# Altium footprint library MEBot.PcbLib: 161 footprints (part 8 of 11)
Each footprint in its own frame and in the unit in brackets; x right, y up, seen from the top. Pads: shape width x height; smd on the part's side, far side on the other; paste and mask are expansions set on the pad; w line width, h text height; cw(c..) or ccw(c..) is an arc to the next point about the centre after c.
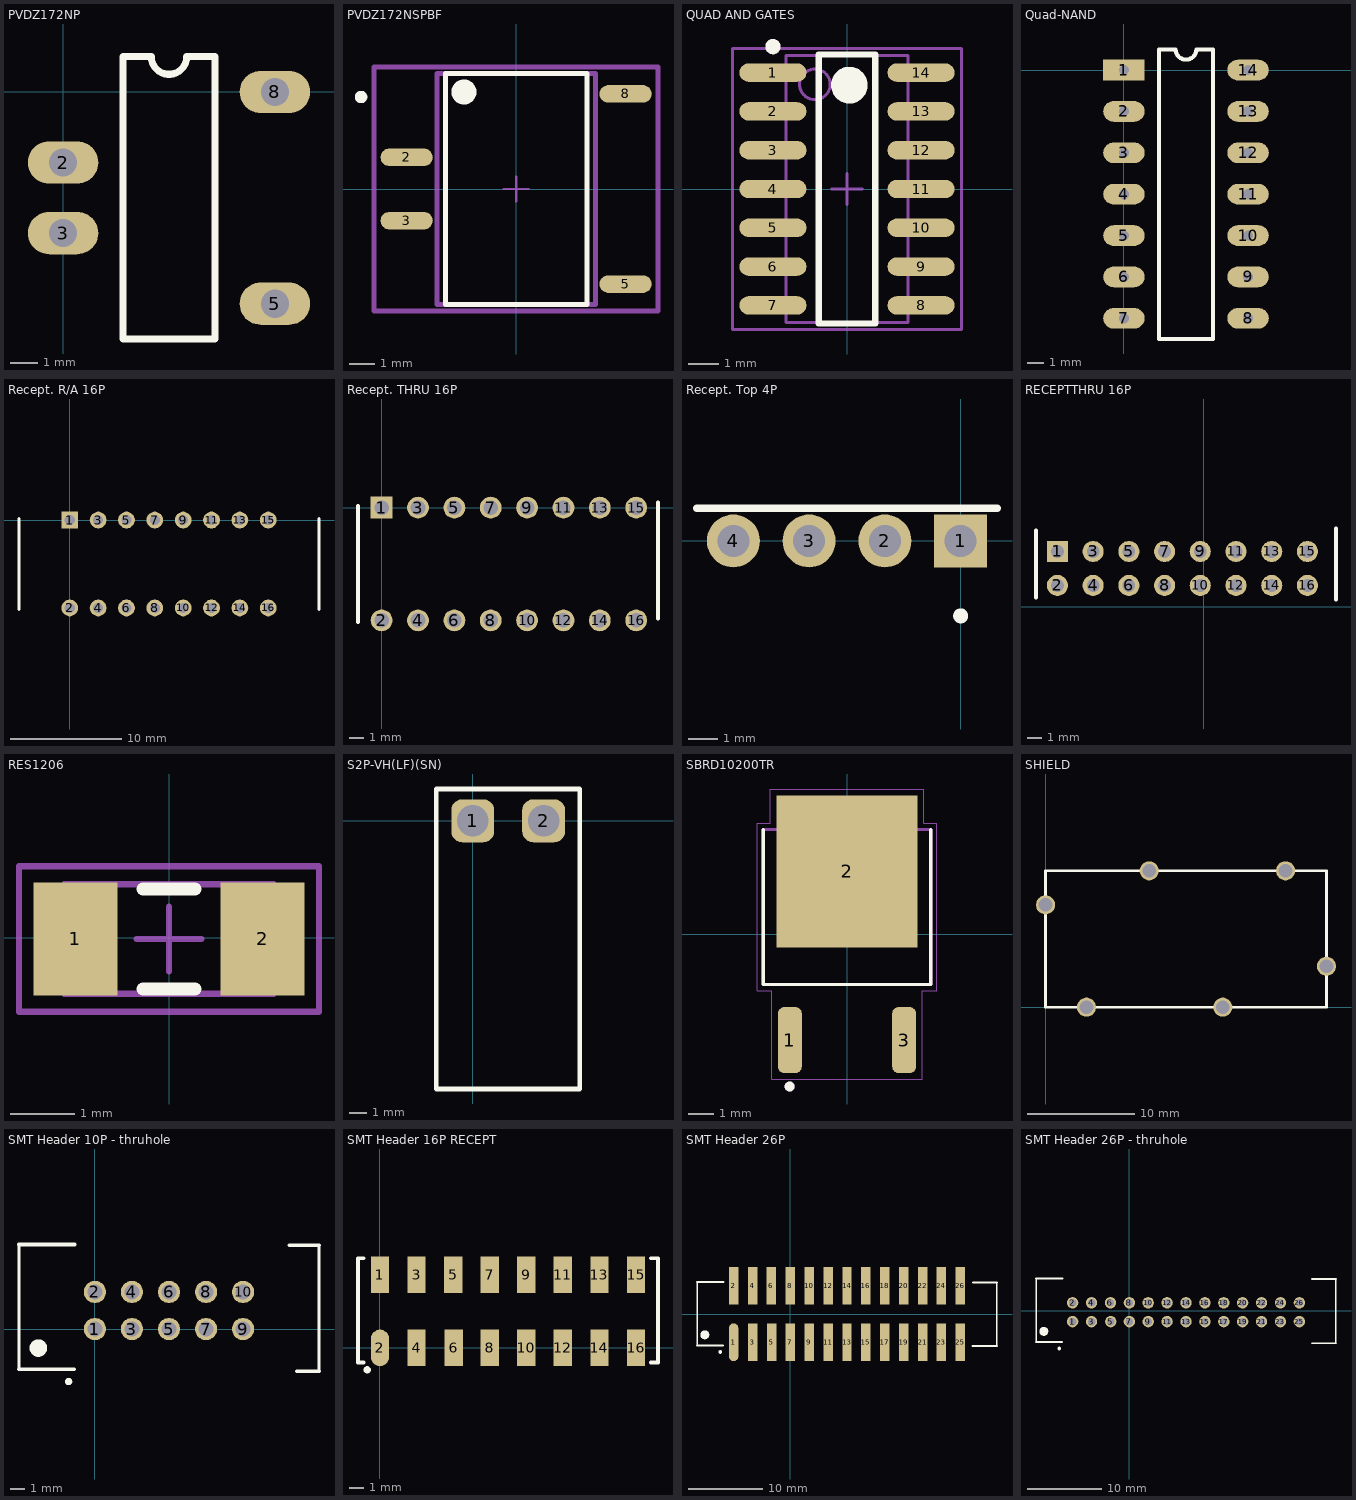
[diagram p7: the footprints below, top view; thin cyan lines are the x and y axes]

## PVDZ172NP [mil]
pads (4):
  oval 100x60 hole 40: 2(0,-100) 3(0,-200) 5(300,-300) 8(300,0)
Top Overlay:
  lines w10: 85,-350 85,50 125,50 ccw(c150,50) 175,50 215,50 215,-350 85,-350

## PVDZ172NSPBF [mil] "PVDZ Photovoltaic 1.5 A 60 V 0.25 Ohm SPST (1 Form A) Solid State Relay -MDIP-8"
pads (4):
  rrect100% 82.46x27.57 smd paste+0 mask+0: 2(-172.65,50) 3(-172.65,-50) 5(172.65,-150) 8(172.65,150)
Top Overlay:
  circle w19.68: c-82.2,152.95 r9.84
  circle w9.84: c-244.39,145.08 r4.92
  lines w7.87: -111.73,-182.48 111.73,-182.48 111.73,182.48 -111.73,182.48 -111.73,-182.48
Top 3D Body:
  lines w7.87: -125,-182.48 125,-182.48 125,182.48 -125,182.48 -125,-182.48
Top Courtyard:
  lines w7.87: -223.72,-192.32 223.72,-192.32 223.72,192.32 -223.72,192.32 -223.72,-192.32
Top Assembly:
  lines w7.87: -223.72,-192.32 223.72,-192.32 223.72,192.32 -223.72,192.32 -223.72,-192.32
  text ".Designator" at 0,7.38 h39.37
Board:
  lines w3.94: -19.68,0 19.68,0 ; 0,-19.68 0,19.68
3D body "Relay_Infineon_PVDZ172NSPBF_eec.STEP": height 10, standoff 0, extent -223.72,-192.32 223.72,192.32

## QUAD AND GATES [mm] "SOIC, 14-Leads, Body 8.8x4.0mm (max), Pitch 1.27mm, IPC Medium Density"
height 1.75
pads (14):
  oval 2.2x0.6 smd: 1(-2.425,3.81) 2(-2.425,2.54) 3(-2.425,1.27) 4(-2.425,0) 5(-2.425,-1.27) 6(-2.425,-2.54) 7(-2.425,-3.81) 8(2.425,-3.81) 9(2.425,-2.54) 10(2.425,-1.27) 11(2.425,0) 12(2.425,1.27) 13(2.425,2.54) 14(2.425,3.81)
Top Overlay:
  circle w0.25: c-2.425,4.66 r0.125
  circle w0.6: c0.075,3.4 r0.3
  lines w0.2: -0.925,-4.4 -0.925,4.4 0.925,4.4 0.925,-4.4 -0.925,-4.4
Mechanical 13:
  circle w0.1: c-1.05,3.425 r0.5
  lines w0.1: -2,-4.375 -2,4.375 2,4.375 2,-4.375 -2,-4.375
Mechanical 15:
  lines w0.1: -0.5,0 0.5,0 ; 0,-0.5 0,0.5 ; -3.75,-4.6 -3.75,4.6 3.75,4.6 3.75,-4.6 -3.75,-4.6
3D body: height 1.75, standoff 0.25, extent -2,-4.375 2,4.375

## Quad-NAND [mil]
pads (14):
  rect 100x50 hole 25: 1(0,0)
  oval 100x50 hole 25: 2(0,-100) 3(0,-200) 4(0,-300) 5(0,-400) 6(0,-500) 7(0,-600) 8(300,-600) 9(300,-500) 10(300,-400) 11(300,-300) 12(300,-200) 13(300,-100) 14(300,0)
Top Overlay:
  lines w10: 85,-650 215,-650 215,50 175,50 cw(c150,50) 125,50 85,50 85,-650

## Recept. R/A 16P [mm] "Tyco P/N 5-532956-8"
height 6.05
pads (16):
  rect 1.5x1.5 hole 0.9: 1(0,0)
  round 1.5 hole 0.9: 2(0,-7.874) 3(2.54,0) 4(2.54,-7.874) 5(5.08,0) 6(5.08,-7.874) 7(7.62,0) 8(7.62,-7.874) 9(10.16,0) 10(10.16,-7.874) 11(12.7,0) 12(12.7,-7.874) 13(15.24,0) 14(15.24,-7.874) 15(17.78,0) 16(17.78,-7.874)
Top Overlay:
  lines w0.254: -4.547,-8.001 -4.547,0.127 ; 22.327,-8.001 22.327,0.127
3D body "c-5-532956-2-af1-3d.stp": height 6.02, standoff -2.94, extent -4.537,-7.928 22.337,0.2

## Recept. THRU 16P [mil] "Tyco P/N 5-532956-8"
height 238.19
pads (16):
  rect 60x60 hole 40: 1(0,0)
  round 60 hole 40: 2(0,-310) 3(100,0) 4(100,-310) 5(200,0) 6(200,-310) 7(300,0) 8(300,-310) 9(400,0) 10(400,-310) 11(500,0) 12(500,-310) 13(600,0) 14(600,-310) 15(700,0) 16(700,-310)
Top Overlay:
  lines w10: -65,-315 -65,5 ; 760,-305 760,15
3D body "71991308lf.stp": height 290, standoff -99.76, extent -50,-303.94 746.85,3.94

## Recept. Top 4P [mil] "4 pin Molex Receptacle - 22-02-2045"
height 310
pads (4):
  rect 70x70 hole 42: 1(0,0)
  round 70 hole 42: 2(-100,0) 3(-200,0) 4(-300,0)
Top Overlay:
  circle w9.84: c0,-99 r4.92
  lines w10: -348,43 48,43
3D body "022182041.stp": height 310, standoff -132, extent -348,-145 48,160

## RECEPTTHRU 16P [mm]
pads (16):
  rect 1.5x1.5 hole 0.9: 1(-10.414,3.937)
  round 1.5 hole 0.9: 2(-10.414,1.524) 3(-7.874,3.937) 4(-7.874,1.524) 5(-5.334,3.937) 6(-5.334,1.524) 7(-2.794,3.937) 8(-2.794,1.524) 9(-0.254,3.937) 10(-0.254,1.524) 11(2.286,3.937) 12(2.286,1.524) 13(4.826,3.937) 14(4.826,1.524) 15(7.366,3.937) 16(7.366,1.524)
Top Overlay:
  lines w0.254: -11.938,0.635 -11.938,5.461 ; 9.398,0.508 9.398,5.588
3D body "recept16pthru.stp": height 8.89, standoff -2.71, extent -11.684,0.254 8.636,5.314

## RES1206 [mm] "Chip Resistor, 2-Leads, Body 3.1x1.6mm, IPC Medium Density"
height 0.65
pads (2):
  rect 1.3x1.75 smd: 1(-1.457,-0.019) 2(1.443,-0.019)
Top Overlay:
  lines w0.2: -0.407,-0.794 0.393,-0.794 ; -0.407,0.756 0.393,0.756
Mechanical 13:
  lines w0.1: -1.632,-0.869 -1.632,0.831 1.618,0.831 1.618,-0.869 -1.632,-0.869
Mechanical 15:
  lines w0.1: -0.507,-0.019 0.493,-0.019 ; -0.007,-0.519 -0.007,0.481 ; -2.332,-1.144 -2.332,1.106 2.318,1.106 2.318,-1.144 -2.332,-1.144
3D body: height 0.65, standoff 0, extent -1.632,-0.869 1.618,0.831

## S2P-VH(LF)(SN) [mm] "CONN HEADER R/A 2POS 3.96MM"
pads (2):
  rrect50% 2.4x2.4 hole 1.75: 1(0,0) 2(3.962,0)
Top Overlay:
  lines w0.254: -2.032,-14.986 -2.032,1.778 5.969,1.778 5.969,-14.986 -2.032,-14.986
3D body "User Library-B2PS-VH.STEP": height 8.57, standoff -3.83, extent -2.025,-14.835 5.835,0.635

## SBRD10200TR [mm] "DIODE SCHOTTKY 200V 10A DPAK"
pads (3):
  rrect50% 0.95x2.64 smd: 1(-2.286,-4.24) 3(2.286,-4.24)
  rect 5.63x6.09 smd paste-4: 2(0,2.51)
Top Overlay:
  circle w0.2: c-2.3,-6.1 r0.1
  lines w0.127: -3.35,4.185 -3.35,-2.015 3.35,-2.015 3.35,4.185
Bottom Overlay:
  lines w0.127: 3.35,-2.015 3.35,4.185
Top Paste:
  region: 0.655,1.78 -0.655,1.78 -0.655,3.24 0.655,3.24
  region: 0.655,3.81 -0.655,3.81 -0.655,5.27 0.655,5.27
  region: 0.655,-0.25 -0.655,-0.25 -0.655,1.21 0.655,1.21
  region: -1.225,3.81 -2.535,3.81 -2.535,5.27 -1.225,5.27
  region: -1.225,1.78 -2.535,1.78 -2.535,3.24 -1.225,3.24
  region: -1.225,-0.25 -2.535,-0.25 -2.535,1.21 -1.225,1.21
  region: 2.535,-0.25 1.225,-0.25 1.225,1.21 2.535,1.21
  region: 2.535,3.81 1.225,3.81 1.225,5.27 2.535,5.27
  region: 2.535,1.78 1.225,1.78 1.225,3.24 2.535,3.24
Mechanical 13:
  circle w0.2: c-2.3,-6.1 r0.1
  lines w0.127: -3.35,-2.015 3.35,-2.015 3.35,4.185 -3.35,4.185 -3.35,-2.015
Mechanical 15:
  lines w0.05: -3.6,-2.27 -3.6,4.44 -3.065,4.44 -3.065,5.81 3.065,5.81 3.065,4.44 3.6,4.44 3.6,-2.27 3.02,-2.27 3.02,-5.81 -3.02,-5.81 -3.02,-2.27 -3.6,-2.27

## SHIELD [mil] "RF SHIELD 0.5\" X 1\" THROUGH HOLE"
height 5118.11
pads (6):
  round 70 hole 50: ""(0,375) ""(150,0) ""(380,500) ""(650,0) ""(880,500) ""(1030,150)
Top Overlay:
  lines w10: 0,0 1030,0 1030,500 0,500 0,0

## SMT Header 10P - thruhole [mil] "Box Header, SMT 10 Leads; Row Spacing 6.86 mm; Pitch 2.54 mm"
height 393.7
pads (10):
  round 60 hole 40: 1(0,0) 2(0,100) 3(100,0) 4(100,100) 5(200,0) 6(200,100) 7(300,0) 8(300,100) 9(400,0) 10(400,100)
Top Overlay:
  circle w23.62: c-152.76,-51.38 r11.81
  circle w9.84: c-71.06,-141.93 r4.92
  lines w7.87: -205,-108.46 -205,227.95 ; 605,-114.37 605,226.44
  lines w10: -205,-108.46 -56.3,-108.46 ; -205,227.95 -54.53,227.95 ; 525,226.44 605,226.44 ; 545,-114.37 605,-114.37
3D body "10PTHRU HEADER.stp": height 370, standoff -132, extent -189,-111.14 599,228.86

## SMT Header 16P RECEPT [mm] "Box Header, SMT 16 Leads; Row Spacing 6.86 mm; Pitch 2.54 mm"
height 10
pads (16):
  rect 1.27x2.54 smd: 1(0,5.08) 3(2.54,5.08) 4(2.54,0) 5(5.08,5.08) 6(5.12,0) 7(7.62,5.08) 8(7.62,0) 9(10.16,5.08) 10(10.16,0) 11(12.7,5.08) 12(12.7,0) 13(15.24,5.08) 14(15.24,0) 15(17.78,5.08) 16(17.78,0)
  rrect100% 1.27x2.54 smd: 2(0,0)
Top Overlay:
  circle w0.25: c-0.887,-1.524 r0.125
  lines w0.254: -1.143,-1.016 -1.524,-1.016 -1.524,6.223 -1.143,6.223 ; 18.796,-1.016 19.304,-1.016 19.304,6.223 18.796,6.223
3D body "966216-2000-XX-XX1.stp": height 5.16, standoff 0.16, extent -1.27,-0.762 19.05,5.938

## SMT Header 26P [mm] "Box Header, SMT 26 Leads; Row Spacing 6.86 mm; Pitch 2.54 mm"
height 10
pads (26):
  rrect100% 1.27x5.08 smd: 1(-7.62,-3.8)
  rect 1.27x5.08 smd: 2(-7.62,3.8) 3(-5.08,-3.8) 4(-5.08,3.8) 5(-2.5,-3.8) 6(-2.54,3.8) 7(0,-3.8) 8(0,3.8) 9(2.54,-3.8) 10(2.54,3.8) 11(5.08,-3.8) 12(5.08,3.8) 13(7.62,-3.8) 14(7.62,3.8) 15(10.16,-3.8) 16(10.16,3.8) 17(12.7,-3.8) 18(12.7,3.8) 19(15.24,-3.8) 20(15.24,3.8) 21(17.78,-3.8) 22(17.78,3.8) 23(20.32,-3.8) 24(20.32,3.8) 25(22.86,-3.8) 26(22.86,3.8)
Top Overlay:
  circle w0.6: c-11.5,-2.8 r0.3
  circle w0.25: c-9.425,-5.1 r0.125
  lines w0.2: -12.55,-4.25 -12.55,4.295 ; 27.79,-4.295 27.79,4.23
  lines w0.254: -12.55,-4.25 -9.05,-4.25 ; -12.55,4.295 -9.005,4.295 ; 24.505,-4.295 27.79,-4.295 ; 24.53,4.23 27.79,4.23
3D body "HEADER26P-SMD.stp": height 10.16, standoff 0, extent -12.598,-5.613 27.737,5.563

## SMT Header 26P - thruhole [mil] "Box Header, SMT 34 Leads; Row Spacing 6.86 mm; Pitch 2.54 mm"
height 393.7
pads (26):
  round 60 hole 40: 1(-300,-58.86) 2(-300,41.14) 3(-200,-58.86) 4(-200,41.14) 5(-98.43,-58.86) 6(-100,41.14) 7(0,-58.86) 8(0,41.14) 9(100,-58.86) 10(100,41.14) 11(200,-58.86) 12(200,41.14) 13(300,-58.86) 14(300,41.14) 15(400,-58.86) 16(400,41.14) 17(500,-58.86) 18(500,41.14) 19(600,-58.86) 20(600,41.14) 21(700,-58.86) 22(700,41.14) 23(800,-58.86) 24(800,41.14) 25(900,-58.86) 26(900,41.14)
Top Overlay:
  circle w23.62: c-452.76,-110.24 r11.81
  circle w9.84: c-371.06,-200.79 r4.92
  lines w7.87: -494.09,-167.32 -494.09,169.09 ; 1094.09,-173.23 1094.09,167.58
  lines w10: -494.09,-167.32 -356.3,-167.32 ; -494.09,169.09 -354.53,169.09 ; 968,-173.23 1094,-173.23 ; 968,167.58 1094.09,167.58
3D body "HEADER26P-THRU.stp": height 370, standoff -112, extent -493,-186 1095,154